# Altium schematic symbol library Capacitor - Aluminium TH.SchLib: 4591 symbols (part 5 of 27) (continued)
## B43821A9475M (continued)
CAP ALUM 4.7UF 20% 400V RADIAL; Part Number: B43821A9475M; Manufacturer: EPCOS (TDK); TemperatureRange: -25C ~ 85C; Type: Polar; Ripple Current: 60mA @ 120Hz; Value: 4.7uF; PartId: 25363; Supplier 1: Digi-Key; Supplier Part Number 1: 495-6011-ND; ComponentLink1Description: Datasheet; ComponentLink1URL: //media.digikey.com/pdf/Data%20Sheets/Epcos%20PDFs/B41821_43821_Series_2006.pdf; ComponentLink2Description: Digi-Key Listing; ComponentLink2URL: https://www.digikey.com/product-detail/en/epcos-tdk/B43821A9475M/495-6011-ND/3543703; Tolerance: 20%; Voltage: 400V; Price: 0.71; Device Package: Radial, Can, 10mm
footprint CAP AL TH D10 L5 H17.5
pins: 1, 2

## B43821F9226M
designator C?, comment 22uF  (value not drawn)
CAP ALUM 22UF 20% 400V RADIAL; Part Number: B43821F9226M; Manufacturer: EPCOS (TDK); TemperatureRange: -25C ~ 85C; Type: Polar; Ripple Current: 200mA @ 120Hz; Value: 22uF; PartId: 24082; Supplier 1: Digi-Key; Supplier Part Number 1: 495-6066-ND; ComponentLink1Description: Datasheet; ComponentLink1URL: http://en.tdk.eu/inf/20/30/db/aec_2013/B41821_B43821.pdf; ComponentLink2Description: Digi-Key Listing; ComponentLink2URL: https://www.digikey.com/product-detail/en/epcos-tdk/B43821F9226M/495-6066-ND/3544459; Tolerance: 20%; Voltage: 400V; Price: 1.22; Device Package: Radial, Can, 12.5mm
footprint CAP AL TH D12.5 L5 H27
pins: 1, 2

## B43851A4106M
designator C?, comment 10uF  (value not drawn)
CAP ALUM 10UF 20% 350V RADIAL; Part Number: B43851A4106M; Manufacturer: EPCOS (TDK); Type: Polar; Ripple Current: 67mA @ 120Hz; Value: 10uF; PartId: 25986; Supplier 1: Digi-Key; Supplier Part Number 1: 495-6031-ND; ComponentLink1Description: Datasheet; ComponentLink1URL: //media.digikey.com/pdf/Data%20Sheets/Epcos%20PDFs/B41851,B43851.pdf; ComponentLink2Description: Digi-Key Listing; ComponentLink2URL: https://www.digikey.com/product-detail/en/epcos-tdk/B43851A4106M/495-6031-ND/3543989; Tolerance: 20%; Voltage: 350V; Price: 0.96; Device Package: Radial, Can, 10mm
footprint CAP AL TH D10 L5 H22
pins: 1, 2

## B43851A9106M
designator C?, comment 10uF  (value not drawn)
CAP ALUM 10UF 20% 400V RADIAL; Part Number: B43851A9106M; Manufacturer: EPCOS (TDK); Type: Polar; Ripple Current: 67mA @ 120Hz; Value: 10uF; PartId: 25950; Supplier 1: Digi-Key; Supplier Part Number 1: 495-6020-ND; ComponentLink1Description: Datasheet; ComponentLink1URL: http://en.tdk.eu/inf/20/30/db/aec_2013/B41851_B43851.pdf; ComponentLink2Description: Digi-Key Listing; ComponentLink2URL: https://www.digikey.com/product-detail/en/epcos-tdk/B43851A9106M/495-6020-ND/3543992; Tolerance: 20%; Voltage: 400V; Price: 0.76; Device Package: Radial, Can, 10mm
footprint CAP AL TH D10 L5 H22
pins: 1, 2

## B43851A9226M
designator C?, comment 22uF  (value not drawn)
CAP ALUM 22UF 20% 400V RADIAL; Part Number: B43851A9226M; Manufacturer: EPCOS (TDK); Type: Polar; Ripple Current: 126mA @ 120Hz; Value: 22uF; PartId: 26487; Supplier 1: Digi-Key; Supplier Part Number 1: 495-6067-ND; ComponentLink1Description: Datasheet; ComponentLink1URL: //media.digikey.com/pdf/Data%20Sheets/Epcos%20PDFs/B41851,B43851.pdf; ComponentLink2Description: Digi-Key Listing; ComponentLink2URL: https://www.digikey.com/product-detail/en/epcos-tdk/B43851A9226M/495-6067-ND/3544470; Tolerance: 20%; Voltage: 400V; Price: 1.83; Device Package: Radial, Can, 16mm
footprint CAP AL TH D16 L7.5 H22
pins: 1, 2

## B43851A9336M
designator C?, comment 33uF  (value not drawn)
CAP ALUM 33UF 20% 400V RADIAL; Part Number: B43851A9336M; Manufacturer: EPCOS (TDK); Type: Polar; Ripple Current: 168mA @ 120Hz; Value: 33uF; PartId: 26963; Supplier 1: Digi-Key; Supplier Part Number 1: 495-6068-ND; ComponentLink1Description: Datasheet; ComponentLink1URL: //media.digikey.com/pdf/Data%20Sheets/Epcos%20PDFs/B41851,B43851.pdf; ComponentLink2Description: Digi-Key Listing; ComponentLink2URL: https://www.digikey.com/product-detail/en/epcos-tdk/B43851A9336M/495-6068-ND/3544472; Tolerance: 20%; Voltage: 400V; Price: 2.3; Device Package: Radial, Can, 16mm
footprint CAP AL TH D16 L7.5 H27
pins: 1, 2

## B43851F9226M
designator C?, comment 22uF  (value not drawn)
CAP ALUM 22UF 20% 400V RADIAL; Part Number: B43851F9226M; Manufacturer: EPCOS (TDK); Type: Polar; Ripple Current: 140mA @ 120Hz; Value: 22uF; PartId: 24100; Supplier 1: Digi-Key; Supplier Part Number 1: 495-6069-ND; ComponentLink1Description: Datasheet; ComponentLink1URL: http://en.tdk.eu/inf/20/30/db/aec_2013/B41851_B43851.pdf; ComponentLink2Description: Digi-Key Listing; ComponentLink2URL: https://www.digikey.com/product-detail/en/epcos-tdk/B43851F9226M/495-6069-ND/3544476; Tolerance: 20%; Voltage: 400V; Price: 1.31; Device Package: Radial, Can, 12.5mm
footprint CAP AL TH D12.5 L5 H27
pins: 1, 2

## B43858A4106M
designator C?, comment 10uF  (value not drawn)
CAP ALUM 10UF 20% 350V RADIAL; Part Number: B43858A4106M; Manufacturer: EPCOS (TDK); TemperatureRange: -25C ~ 105C; Type: Polar; Ripple Current: 300mA @ 100kHz; Value: 10uF; PartId: 24112; Supplier 1: Digi-Key; Supplier Part Number 1: 495-6070-ND; ComponentLink1Description: Datasheet; ComponentLink1URL: //media.digikey.com/pdf/Data%20Sheets/Epcos%20PDFs/B43858_Oct_2002.pdf; ComponentLink2Description: Digi-Key Listing; ComponentLink2URL: https://www.digikey.com/product-detail/en/epcos-tdk/B43858A4106M/495-6070-ND/3544485; Tolerance: 20%; Voltage: 350V; Price: 1.38; Device Package: Radial, Can, 12.5mm
footprint CAP AL TH D12.5 L5 H27
pins: 1, 2

## B43858A9475M
designator C?, comment 4.7uF  (value not drawn)
CAP ALUM 4.7UF 20% 400V RADIAL; Part Number: B43858A9475M; Manufacturer: EPCOS (TDK); TemperatureRange: -25C ~ 105C; Type: Polar; Ripple Current: 180mA @ 100kHz; Value: 4.7uF; PartId: 25989; Supplier 1: Digi-Key; Supplier Part Number 1: 495-6032-ND; ComponentLink1Description: Datasheet; ComponentLink1URL: //media.digikey.com/pdf/Data%20Sheets/Epcos%20PDFs/B43858_Oct_2002.pdf; ComponentLink2Description: Digi-Key Listing; ComponentLink2URL: https://www.digikey.com/product-detail/en/epcos-tdk/B43858A9475M/495-6032-ND/3544023; Tolerance: 20%; Voltage: 400V; Price: 1.02; Device Package: Radial, Can, 10mm
footprint CAP AL TH D10 L5 H22
pins: 1, 2

## B43858C4475M
designator C?, comment 4.7uF  (value not drawn)
CAP ALUM 4.7UF 20% 350V RADIAL; Part Number: B43858C4475M; Manufacturer: EPCOS (TDK); TemperatureRange: -25C ~ 105C; Type: Polar; Ripple Current: 180mA @ 100kHz; Value: 4.7uF; PartId: 25405; Supplier 1: Digi-Key; Supplier Part Number 1: 495-6014-ND; ComponentLink1Description: Datasheet; ComponentLink1URL: //media.digikey.com/pdf/Data%20Sheets/Epcos%20PDFs/B43858_Nov08.pdf; ComponentLink2Description: Digi-Key Listing; ComponentLink2URL: https://www.digikey.com/product-detail/en/epcos-tdk/B43858C4475M/495-6014-ND/3543744; Tolerance: 20%; Voltage: 350V; Price: 0.81; Device Package: Radial, Can, 10mm
footprint CAP AL TH D10 L5 H17.5
pins: 1, 2

## B43858C9106M
designator C?, comment 10uF  (value not drawn)
CAP ALUM 10UF 20% 400V RADIAL; Part Number: B43858C9106M; Manufacturer: EPCOS (TDK); TemperatureRange: -25C ~ 105C; Type: Polar; Ripple Current: 300mA @ 100kHz; Value: 10uF; PartId: 25988; Supplier 1: Digi-Key; Supplier Part Number 1: 495-6033-ND; ComponentLink1Description: Datasheet; ComponentLink1URL: //media.digikey.com/pdf/Data%20Sheets/Epcos%20PDFs/B43858_Nov08.pdf; ComponentLink2Description: Digi-Key Listing; ComponentLink2URL: https://www.digikey.com/product-detail/en/epcos-tdk/B43858C9106M/495-6033-ND/3544046; Tolerance: 20%; Voltage: 400V; Price: 1; Device Package: Radial, Can, 10mm
footprint CAP AL TH D10 L5 H22
pins: 1, 2

## B43858C9685M
designator C?, comment 6.8uF  (value not drawn)
CAP ALUM 6.8UF 20% 400V RADIAL; Part Number: B43858C9685M; Manufacturer: EPCOS (TDK); TemperatureRange: -25C ~ 105C; Type: Polar; Ripple Current: 270mA @ 100kHz; Value: 6.8uF; PartId: 25409; Supplier 1: Digi-Key; Supplier Part Number 1: 495-6016-ND; ComponentLink1Description: Datasheet; ComponentLink1URL: //media.digikey.com/pdf/Data%20Sheets/Epcos%20PDFs/B43858_Nov08.pdf; ComponentLink2Description: Digi-Key Listing; ComponentLink2URL: https://www.digikey.com/product-detail/en/epcos-tdk/B43858C9685M/495-6016-ND/3543752; Tolerance: 20%; Voltage: 400V; Price: 0.83; Device Package: Radial, Can, 10mm
footprint CAP AL TH D10 L5 H17.5
pins: 1, 2

## B43858F2476M
designator C?, comment 47uF  (value not drawn)
CAP ALUM 47UF 20% 250V RADIAL; Part Number: B43858F2476M; Manufacturer: EPCOS (TDK); TemperatureRange: -40C ~ 105C; Type: Polar; Ripple Current: 840mA @ 100kHz; Value: 47uF; PartId: 26943; Supplier 1: Digi-Key; Supplier Part Number 1: 495-6071-ND; ComponentLink1Description: Datasheet; ComponentLink1URL: //media.digikey.com/pdf/Data%20Sheets/Epcos%20PDFs/B43858_Oct_2002.pdf; ComponentLink2Description: Digi-Key Listing; ComponentLink2URL: https://www.digikey.com/product-detail/en/epcos-tdk/B43858F2476M/495-6071-ND/3544507; Tolerance: 20%; Voltage: 250V; Price: 1.93; Device Package: Radial, Can, 16mm
footprint CAP AL TH D16 L7.5 H27
pins: 1, 2

## B43866C5156M
designator C?, comment 15uF  (value not drawn)
CAP ALUM 15UF 20% 450V RADIAL; Part Number: B43866C5156M; Manufacturer: EPCOS (TDK); TemperatureRange: -25C ~ 125C; Type: Polar; Ripple Current: 250mA @ 100kHz; Value: 15uF; PartId: 24141; Supplier 1: Digi-Key; Supplier Part Number 1: 495-6072-ND; ComponentLink1Description: Datasheet; ComponentLink1URL: //media.digikey.com/pdf/Data%20Sheets/Epcos%20PDFs/B43866_Series_2010.pdf; ComponentLink2Description: Digi-Key Listing; ComponentLink2URL: https://www.digikey.com/product-detail/en/epcos-tdk/B43866C5156M/495-6072-ND/3500152; Tolerance: 20%; Voltage: 450V; Price: 1.48; Device Package: Radial, Can, 12.5mm
footprint CAP AL TH D12.5 L5 H27
pins: 1, 2

## B43866C9106M
designator C?, comment 10uF  (value not drawn)
CAP ALUM 10UF 20% 400V RADIAL; Part Number: B43866C9106M; Manufacturer: EPCOS (TDK); TemperatureRange: -25C ~ 125C; Type: Polar; Ripple Current: 160mA @ 100kHz; Value: 10uF; PartId: 25987; Supplier 1: Digi-Key; Supplier Part Number 1: 495-6034-ND; ComponentLink1Description: Datasheet; ComponentLink1URL: //media.digikey.com/pdf/Data%20Sheets/Epcos%20PDFs/B43866_Series_2010.pdf; ComponentLink2Description: Digi-Key Listing; ComponentLink2URL: https://www.digikey.com/product-detail/en/epcos-tdk/B43866C9106M/495-6034-ND/3500158; Tolerance: 20%; Voltage: 400V; Price: 0.99; Device Package: Radial, Can, 10mm
footprint CAP AL TH D10 L5 H22
pins: 1, 2

## B43888F2107M
designator C?, comment 100uF  (value not drawn)
CAP ALUM 100UF 20% 250V RADIAL; Part Number: B43888F2107M; Manufacturer: EPCOS (TDK); Type: Polar; Ripple Current: 1.18A @ 100kHz; Value: 100uF; PartId: 27273; Supplier 1: Digi-Key; Supplier Part Number 1: 495-6080-ND; ComponentLink1Description: Datasheet; ComponentLink1URL: //media.digikey.com/pdf/Data%20Sheets/Epcos%20PDFs/B43888_Series.pdf; ComponentLink2Description: Digi-Key Listing; ComponentLink2URL: https://www.digikey.com/product-detail/en/epcos-tdk/B43888F2107M/495-6080-ND/3544680; Tolerance: 20%; Voltage: 250V; Price: 3.05; Device Package: Radial, Can, 16mm
footprint CAP AL TH D16 L7.5 H33.5
pins: 1, 2

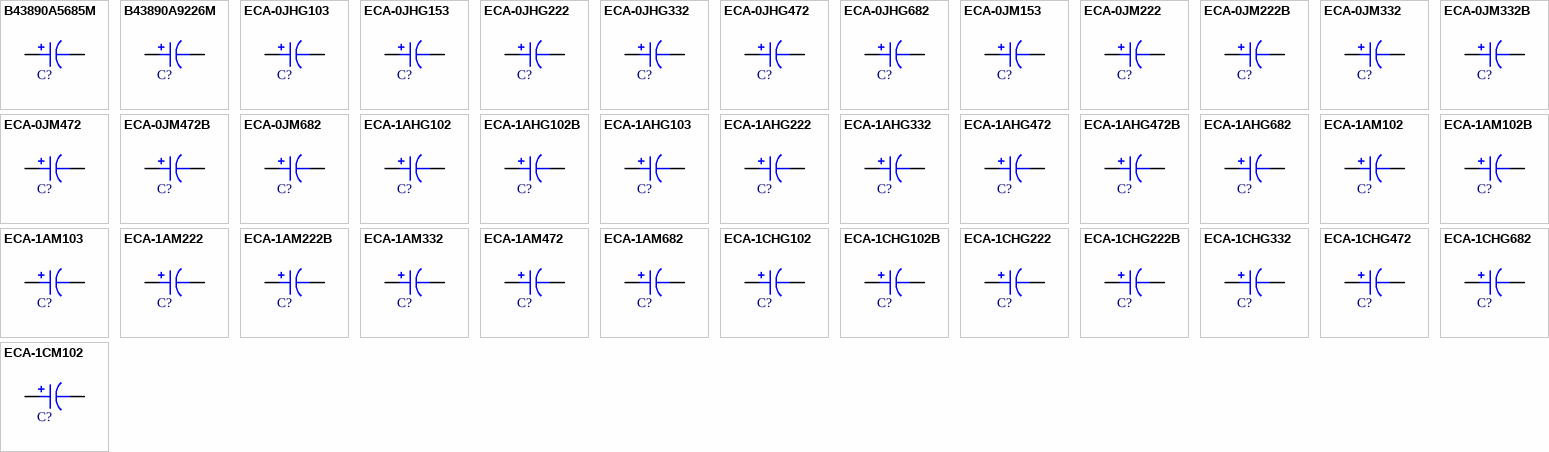
[diagram p19: symbols B43890A5685M to ECA-1CM102]

## B43890A5685M
designator C?, comment 6.8uF  (value not drawn)
CAP ALUM 6.8UF 20% 450V RADIAL; Part Number: B43890A5685M; Manufacturer: EPCOS (TDK); TemperatureRange: -25C ~ 105C; Type: Polar; Ripple Current: 262mA @ 100kHz; Value: 6.8uF; PartId: 25967; Supplier 1: Digi-Key; Supplier Part Number 1: 495-6035-ND; ComponentLink1Description: Datasheet; ComponentLink1URL: https://en.tdk.eu/inf/20/30/db/aec/B43890.pdf; ComponentLink2Description: Digi-Key Listing; ComponentLink2URL: https://www.digikey.com/product-detail/en/epcos-tdk/B43890A5685M/495-6035-ND/3500178; Tolerance: 20%; Voltage: 450V; Price: 0.85; Device Package: Radial, Can, 10mm
footprint CAP AL TH D10 L5 H22
pins: 1, 2

## B43890A9226M
designator C?, comment 22uF  (value not drawn)
CAP ALUM 22UF 20% 400V RADIAL; Part Number: B43890A9226M; Manufacturer: EPCOS (TDK); TemperatureRange: -25C ~ 105C; Type: Polar; Ripple Current: 590mA @ 100kHz; Value: 22uF; PartId: 24084; Supplier 1: Digi-Key; Supplier Part Number 1: 495-6073-ND; ComponentLink1Description: Datasheet; ComponentLink1URL: https://en.tdk.eu/inf/20/30/db/aec/B43890.pdf; ComponentLink2Description: Digi-Key Listing; ComponentLink2URL: https://www.digikey.com/product-detail/en/epcos-tdk/B43890A9226M/495-6073-ND/3500182; Tolerance: 20%; Voltage: 400V; Price: 1.23; Device Package: Radial, Can, 12.5mm
footprint CAP AL TH D12.5 L5 H27
pins: 1, 2

## ECA-0JHG103
designator C?, comment 10000uF  (value not drawn)
CAP ALUM 10000UF 20% 6.3V RADIAL; Part Number: ECA-0JHG103; Manufacturer: Panasonic Electronic Components; TemperatureRange: -55C ~ 105C; Type: Polar; Ripple Current: 1.65A @ 120Hz; Value: 10000uF; PartId: 26881; Supplier 1: Digi-Key; Supplier Part Number 1: P5514-ND; ComponentLink1Description: Datasheet; ComponentLink1URL: https://industrial.panasonic.com/cdbs/www-data/pdf/RDF0000/ABA0000C1038.pdf; ComponentLink2Description: Digi-Key Listing; ComponentLink2URL: https://www.digikey.com/product-detail/en/panasonic-electronic-components/ECA-0JHG103/P5514-ND/245113; Tolerance: 20%; Voltage: 6.3V; Price: 1.31; Device Package: Radial, Can, 16mm
footprint CAP AL TH D16 L7.5 H27
pins: 1, 2

## ECA-0JHG153
designator C?, comment 15000uF  (value not drawn)
CAP ALUM 15000UF 20% 6.3V RADIAL; Part Number: ECA-0JHG153; Manufacturer: Panasonic Electronic Components; TemperatureRange: -55C ~ 105C; Type: Polar; Ripple Current: 2.01A @ 120Hz; Value: 15000uF; PartId: 27113; Supplier 1: Digi-Key; Supplier Part Number 1: P5515-ND; ComponentLink1Description: Datasheet; ComponentLink1URL: https://industrial.panasonic.com/cdbs/www-data/pdf/RDF0000/ABA0000C1038.pdf; ComponentLink2Description: Digi-Key Listing; ComponentLink2URL: https://www.digikey.com/product-detail/en/panasonic-electronic-components/ECA-0JHG153/P5515-ND/245114; Tolerance: 20%; Voltage: 6.3V; Price: 1.75; Device Package: Radial, Can, 16mm
footprint CAP AL TH D16 L7.5 H33.5
pins: 1, 2

## ECA-0JHG222
designator C?, comment 2200uF  (value not drawn)
CAP ALUM 2200UF 20% 6.3V RADIAL; Part Number: ECA-0JHG222; Manufacturer: Panasonic Electronic Components; TemperatureRange: -55C ~ 105C; Type: Polar; Ripple Current: 710mA @ 120Hz; Value: 2200uF; PartId: 25259; Supplier 1: Digi-Key; Supplier Part Number 1: P5510-ND; ComponentLink1Description: Datasheet; ComponentLink1URL: https://industrial.panasonic.com/cdbs/www-data/pdf/RDF0000/ABA0000C1038.pdf; ComponentLink2Description: Digi-Key Listing; ComponentLink2URL: https://www.digikey.com/product-detail/en/panasonic-electronic-components/ECA-0JHG222/P5510-ND/245109; Tolerance: 20%; Voltage: 6.3V; Price: 0.59; Device Package: Radial, Can, 10mm
footprint CAP AL TH D10 L5 H17.5
pins: 1, 2

## ECA-0JHG332
designator C?, comment 3300uF  (value not drawn)
CAP ALUM 3300UF 20% 6.3V RADIAL; Part Number: ECA-0JHG332; Manufacturer: Panasonic Electronic Components; TemperatureRange: -55C ~ 105C; Type: Polar; Ripple Current: 840mA @ 120Hz; Value: 3300uF; PartId: 25875; Supplier 1: Digi-Key; Supplier Part Number 1: P5511-ND; ComponentLink1Description: Datasheet; ComponentLink1URL: https://industrial.panasonic.com/cdbs/www-data/pdf/RDF0000/ABA0000C1038.pdf; ComponentLink2Description: Digi-Key Listing; ComponentLink2URL: https://www.digikey.com/product-detail/en/panasonic-electronic-components/ECA-0JHG332/P5511-ND/245110; Tolerance: 20%; Voltage: 6.3V; Price: 0.64; Device Package: Radial, Can, 10mm
footprint CAP AL TH D10 L5 H22
pins: 1, 2

## ECA-0JHG472
designator C?, comment 4700uF  (value not drawn)
CAP ALUM 4700UF 20% 6.3V RADIAL; Part Number: ECA-0JHG472; Manufacturer: Panasonic Electronic Components; TemperatureRange: -55C ~ 105C; Type: Polar; Ripple Current: 1.09A @ 120Hz; Value: 4700uF; PartId: 23293; Supplier 1: Digi-Key; Supplier Part Number 1: P5512-ND; ComponentLink1Description: Datasheet; ComponentLink1URL: https://industrial.panasonic.com/cdbs/www-data/pdf/RDF0000/ABA0000C1038.pdf; ComponentLink2Description: Digi-Key Listing; ComponentLink2URL: https://www.digikey.com/product-detail/en/panasonic-electronic-components/ECA-0JHG472/P5512-ND/245111; Tolerance: 20%; Voltage: 6.3V; Price: 0.8; Device Package: Radial, Can, 12.5mm
footprint CAP AL TH D12.5 L5 H22
pins: 1, 2

## ECA-0JHG682
designator C?, comment 6800uF  (value not drawn)
CAP ALUM 6800UF 20% 6.3V RADIAL; Part Number: ECA-0JHG682; Manufacturer: Panasonic Electronic Components; TemperatureRange: -55C ~ 105C; Type: Polar; Ripple Current: 1.35A @ 120Hz; Value: 6800uF; PartId: 23972; Supplier 1: Digi-Key; Supplier Part Number 1: P5513-ND; ComponentLink1Description: Datasheet; ComponentLink1URL: https://industrial.panasonic.com/cdbs/www-data/pdf/RDF0000/ABA0000C1038.pdf; ComponentLink2Description: Digi-Key Listing; ComponentLink2URL: https://www.digikey.com/product-detail/en/panasonic-electronic-components/ECA-0JHG682/P5513-ND/245112; Tolerance: 20%; Voltage: 6.3V; Price: 1.01; Device Package: Radial, Can, 12.5mm
footprint CAP AL TH D12.5 L5 H27
pins: 1, 2

## ECA-0JM153
designator C?, comment 15000uF  (value not drawn)
CAP ALUM 15000UF 20% 6.3V RADIAL; Part Number: ECA-0JM153; Manufacturer: Panasonic Electronic Components; TemperatureRange: -40C ~ 85C; Type: Polar; Ripple Current: 1.7A @ 120Hz; Value: 15000uF; PartId: 26996; Supplier 1: Digi-Key; Supplier Part Number 1: P5121-ND; ComponentLink1Description: Datasheet; ComponentLink1URL: https://industrial.panasonic.com/cdbs/www-data/pdf/RDF0000/ABA0000C81.pdf; ComponentLink2Description: Digi-Key Listing; ComponentLink2URL: https://www.digikey.com/product-detail/en/panasonic-electronic-components/ECA-0JM153/P5121-ND/244980; Tolerance: 20%; Voltage: 6.3V; Price: 1.31; Device Package: Radial, Can, 16mm
footprint CAP AL TH D16 L7.5 H33.5
pins: 1, 2

## ECA-0JM222
designator C?, comment 2200uF  (value not drawn)
CAP ALUM 2200UF 20% 6.3V RADIAL; Part Number: ECA-0JM222; Manufacturer: Panasonic Electronic Components; TemperatureRange: -40C ~ 85C; Type: Polar; Ripple Current: 890mA @ 120Hz; Value: 2200uF; PartId: 25193; Supplier 1: Digi-Key; Supplier Part Number 1: P5116-ND; ComponentLink1Description: Datasheet; ComponentLink1URL: https://industrial.panasonic.com/cdbs/www-data/pdf/RDF0000/ABA0000C81.pdf; ComponentLink2Description: Digi-Key Listing; ComponentLink2URL: https://www.digikey.com/product-detail/en/panasonic-electronic-components/ECA-0JM222/P5116-ND/244975; Tolerance: 20%; Voltage: 6.3V; Price: 0.49; Device Package: Radial, Can, 10mm
footprint CAP AL TH D10 L5 H17.5
pins: 1, 2

## ECA-0JM222B
designator C?, comment 2200uF  (value not drawn)
CAP ALUM 2200UF 20% 6.3V RADIAL; Part Number: ECA-0JM222B; Manufacturer: Panasonic Electronic Components; TemperatureRange: -40C ~ 85C; Type: Polar; Ripple Current: 890mA @ 120Hz; Value: 2200uF; PartId: 24999; Supplier 1: Digi-Key; Supplier Part Number 1: P10360TB-ND; ComponentLink1Description: Datasheet; ComponentLink1URL: https://industrial.panasonic.com/cdbs/www-data/pdf/RDF0000/ABA0000C81.pdf; ComponentLink2Description: Digi-Key Listing; ComponentLink2URL: https://www.digikey.com/product-detail/en/panasonic-electronic-components/ECA-0JM222B/P10360TB-ND/268445; Tolerance: 20%; Voltage: 6.3V; Price: 0.1468; Device Package: Radial, Can, 10mm
footprint CAP AL TH D10 L5 H17.5
pins: 1, 2

## ECA-0JM332
designator C?, comment 3300uF  (value not drawn)
CAP ALUM 3300UF 20% 6.3V RADIAL; Part Number: ECA-0JM332; Manufacturer: Panasonic Electronic Components; TemperatureRange: -40C ~ 85C; Type: Polar; Ripple Current: 1.02A @ 120Hz; Value: 3300uF; PartId: 25852; Supplier 1: Digi-Key; Supplier Part Number 1: P5117-ND; ComponentLink1Description: Datasheet; ComponentLink1URL: https://industrial.panasonic.com/cdbs/www-data/pdf/RDF0000/ABA0000C81.pdf; ComponentLink2Description: Digi-Key Listing; ComponentLink2URL: https://www.digikey.com/product-detail/en/panasonic-electronic-components/ECA-0JM332/P5117-ND/244976; Tolerance: 20%; Voltage: 6.3V; Price: 0.55; Device Package: Radial, Can, 10mm
footprint CAP AL TH D10 L5 H22
pins: 1, 2

## ECA-0JM332B
designator C?, comment 3300uF  (value not drawn)
CAP ALUM 3300UF 20% 6.3V RADIAL; Part Number: ECA-0JM332B; Manufacturer: Panasonic Electronic Components; TemperatureRange: -40C ~ 85C; Type: Polar; Ripple Current: 1.02A @ 120Hz; Value: 3300uF; PartId: 25750; Supplier 1: Digi-Key; Supplier Part Number 1: P10361TB-ND; ComponentLink1Description: Datasheet; ComponentLink1URL: https://industrial.panasonic.com/cdbs/www-data/pdf/RDF0000/ABA0000C81.pdf; ComponentLink2Description: Digi-Key Listing; ComponentLink2URL: https://www.digikey.com/product-detail/en/panasonic-electronic-components/ECA-0JM332B/P10361TB-ND/268446; Tolerance: 20%; Voltage: 6.3V; Price: 0.2014; Device Package: Radial, Can, 10mm
footprint CAP AL TH D10 L5 H22
pins: 1, 2

## ECA-0JM472
designator C?, comment 4700uF  (value not drawn)
CAP ALUM 4700UF 20% 6.3V RADIAL; Part Number: ECA-0JM472; Manufacturer: Panasonic Electronic Components; TemperatureRange: -40C ~ 85C; Type: Polar; Ripple Current: 1.17A @ 120Hz; Value: 4700uF; PartId: 23236; Supplier 1: Digi-Key; Supplier Part Number 1: P5118-ND; ComponentLink1Description: Datasheet; ComponentLink1URL: https://industrial.panasonic.com/cdbs/www-data/pdf/RDF0000/ABA0000C81.pdf; ComponentLink2Description: Digi-Key Listing; ComponentLink2URL: https://www.digikey.com/product-detail/en/panasonic-electronic-components/ECA-0JM472/P5118-ND/244977; Tolerance: 20%; Voltage: 6.3V; Price: 0.68; Device Package: Radial, Can, 12.5mm
footprint CAP AL TH D12.5 L5 H22
pins: 1, 2

## ECA-0JM472B
designator C?, comment 4700uF  (value not drawn)
CAP ALUM 4700UF 20% 6.3V RADIAL; Part Number: ECA-0JM472B; Manufacturer: Panasonic Electronic Components; TemperatureRange: -40C ~ 85C; Type: Polar; Ripple Current: 1.17A @ 120Hz; Value: 4700uF; PartId: 23142; Supplier 1: Digi-Key; Supplier Part Number 1: P10362TB-ND; ComponentLink1Description: Datasheet; ComponentLink1URL: https://industrial.panasonic.com/cdbs/www-data/pdf/RDF0000/ABA0000C81.pdf; ComponentLink2Description: Digi-Key Listing; ComponentLink2URL: https://www.digikey.com/product-detail/en/panasonic-electronic-components/ECA-0JM472B/P10362TB-ND/268447; Tolerance: 20%; Voltage: 6.3V; Price: 0.2734; Device Package: Radial, Can, 12.5mm
footprint CAP AL TH D12.5 L5 H22
pins: 1, 2

## ECA-0JM682
designator C?, comment 6800uF  (value not drawn)
CAP ALUM 6800UF 20% 6.3V RADIAL; Part Number: ECA-0JM682; Manufacturer: Panasonic Electronic Components; TemperatureRange: -40C ~ 85C; Type: Polar; Ripple Current: 1.27A @ 120Hz; Value: 6800uF; PartId: 23879; Supplier 1: Digi-Key; Supplier Part Number 1: P5119-ND; ComponentLink1Description: Datasheet; ComponentLink1URL: https://industrial.panasonic.com/cdbs/www-data/pdf/RDF0000/ABA0000C81.pdf; ComponentLink2Description: Digi-Key Listing; ComponentLink2URL: https://www.digikey.com/product-detail/en/panasonic-electronic-components/ECA-0JM682/P5119-ND/244978; Tolerance: 20%; Voltage: 6.3V; Price: 0.83; Device Package: Radial, Can, 12.5mm
footprint CAP AL TH D12.5 L5 H27
pins: 1, 2

## ECA-1AHG102
designator C?, comment 1000uF  (value not drawn)
CAP ALUM 1000UF 20% 10V RADIAL; Part Number: ECA-1AHG102; Manufacturer: Panasonic Electronic Components; TemperatureRange: -55C ~ 105C; Type: Polar; Ripple Current: 460mA @ 120Hz; Value: 1000uF; PartId: 24848; Supplier 1: Digi-Key; Supplier Part Number 1: P5521-ND; ComponentLink1Description: Datasheet; ComponentLink1URL: https://industrial.panasonic.com/cdbs/www-data/pdf/RDF0000/ABA0000C1038.pdf; ComponentLink2Description: Digi-Key Listing; ComponentLink2URL: https://www.digikey.com/product-detail/en/panasonic-electronic-components/ECA-1AHG102/P5521-ND/245120; Tolerance: 20%; Voltage: 10V; Price: 0.47; Device Package: Radial, Can, 10mm
footprint CAP AL TH D10 L5 H14.5
pins: 1, 2

## ECA-1AHG102B
designator C?, comment 1000uF  (value not drawn)
CAP ALUM 1000UF 20% 10V RADIAL; Part Number: ECA-1AHG102B; Manufacturer: Panasonic Electronic Components; TemperatureRange: -55C ~ 105C; Type: Polar; Ripple Current: 460mA @ 120Hz; Value: 1000uF; PartId: 24592; Supplier 1: Digi-Key; Supplier Part Number 1: P19509TB-ND; ComponentLink1Description: Datasheet; ComponentLink1URL: https://industrial.panasonic.com/cdbs/www-data/pdf/RDF0000/ABA0000C1038.pdf; ComponentLink2Description: Digi-Key Listing; ComponentLink2URL: https://www.digikey.com/product-detail/en/panasonic-electronic-components/ECA-1AHG102B/P19509TB-ND/2688625; Tolerance: 20%; Voltage: 10V; Price: 0.1728; Device Package: Radial, Can, 10mm
footprint CAP AL TH D10 L5 H14.5
pins: 1, 2

## ECA-1AHG103
designator C?, comment 10000uF  (value not drawn)
CAP ALUM 10000UF 20% 10V RADIAL; Part Number: ECA-1AHG103; Manufacturer: Panasonic Electronic Components; TemperatureRange: -55C ~ 105C; Type: Polar; Ripple Current: 1.89A @ 120Hz; Value: 10000uF; PartId: 27115; Supplier 1: Digi-Key; Supplier Part Number 1: P5526-ND; ComponentLink1Description: Datasheet; ComponentLink1URL: https://industrial.panasonic.com/cdbs/www-data/pdf/RDF0000/ABA0000C1038.pdf; ComponentLink2Description: Digi-Key Listing; ComponentLink2URL: https://www.digikey.com/product-detail/en/panasonic-electronic-components/ECA-1AHG103/P5526-ND/245125; Tolerance: 20%; Voltage: 10V; Price: 1.75; Device Package: Radial, Can, 16mm
footprint CAP AL TH D16 L7.5 H33.5
pins: 1, 2

## ECA-1AHG222
designator C?, comment 2200uF  (value not drawn)
CAP ALUM 2200UF 20% 10V RADIAL; Part Number: ECA-1AHG222; Manufacturer: Panasonic Electronic Components; TemperatureRange: -55C ~ 105C; Type: Polar; Ripple Current: 760mA @ 120Hz; Value: 2200uF; PartId: 25885; Supplier 1: Digi-Key; Supplier Part Number 1: P5522-ND; ComponentLink1Description: Datasheet; ComponentLink1URL: https://industrial.panasonic.com/cdbs/www-data/pdf/RDF0000/ABA0000C1038.pdf; ComponentLink2Description: Digi-Key Listing; ComponentLink2URL: https://www.digikey.com/product-detail/en/panasonic-electronic-components/ECA-1AHG222/P5522-ND/245121; Tolerance: 20%; Voltage: 10V; Price: 0.65; Device Package: Radial, Can, 10mm
footprint CAP AL TH D10 L5 H22
pins: 1, 2

## ECA-1AHG332
designator C?, comment 3300uF  (value not drawn)
CAP ALUM 3300UF 20% 10V RADIAL; Part Number: ECA-1AHG332; Manufacturer: Panasonic Electronic Components; TemperatureRange: -55C ~ 105C; Type: Polar; Ripple Current: 1A @ 120Hz; Value: 3300uF; PartId: 23330; Supplier 1: Digi-Key; Supplier Part Number 1: P5523-ND; ComponentLink1Description: Datasheet; ComponentLink1URL: https://industrial.panasonic.com/cdbs/www-data/pdf/RDF0000/ABA0000C1038.pdf; ComponentLink2Description: Digi-Key Listing; ComponentLink2URL: https://www.digikey.com/product-detail/en/panasonic-electronic-components/ECA-1AHG332/P5523-ND/245122; Tolerance: 20%; Voltage: 10V; Price: 0.83; Device Package: Radial, Can, 12.5mm
footprint CAP AL TH D12.5 L5 H22
pins: 1, 2

## ECA-1AHG472
designator C?, comment 4700uF  (value not drawn)
CAP ALUM 4700UF 20% 10V RADIAL; Part Number: ECA-1AHG472; Manufacturer: Panasonic Electronic Components; TemperatureRange: -55C ~ 105C; Type: Polar; Ripple Current: 1.26A @ 120Hz; Value: 4700uF; PartId: 23966; Supplier 1: Digi-Key; Supplier Part Number 1: P5524-ND; ComponentLink1Description: Datasheet; ComponentLink1URL: https://industrial.panasonic.com/cdbs/www-data/pdf/RDF0000/ABA0000C1038.pdf; ComponentLink2Description: Digi-Key Listing; ComponentLink2URL: https://www.digikey.com/product-detail/en/panasonic-electronic-components/ECA-1AHG472/P5524-ND/245123; Tolerance: 20%; Voltage: 10V; Price: 1; Device Package: Radial, Can, 12.5mm
footprint CAP AL TH D12.5 L5 H27
pins: 1, 2

## ECA-1AHG472B
designator C?, comment 4700uF  (value not drawn)
CAP ALUM 4700UF 20% 10V RADIAL; Part Number: ECA-1AHG472B; Manufacturer: Panasonic Electronic Components; TemperatureRange: -55C ~ 105C; Type: Polar; Ripple Current: 1.26A @ 120Hz; Value: 4700uF; PartId: 23817; Supplier 1: Digi-Key; Supplier Part Number 1: P19510TB-ND; ComponentLink1Description: Datasheet; ComponentLink1URL: https://industrial.panasonic.com/cdbs/www-data/pdf/RDF0000/ABA0000C1038.pdf; ComponentLink2Description: Digi-Key Listing; ComponentLink2URL: https://www.digikey.com/product-detail/en/panasonic-electronic-components/ECA-1AHG472B/P19510TB-ND/2688635; Tolerance: 20%; Voltage: 10V; Price: 0.4279; Device Package: Radial, Can, 12.5mm
footprint CAP AL TH D12.5 L5 H27
pins: 1, 2

## ECA-1AHG682
designator C?, comment 6800uF  (value not drawn)
CAP ALUM 6800UF 20% 10V RADIAL; Part Number: ECA-1AHG682; Manufacturer: Panasonic Electronic Components; TemperatureRange: -55C ~ 105C; Type: Polar; Ripple Current: 1.57A @ 120Hz; Value: 6800uF; PartId: 26885; Supplier 1: Digi-Key; Supplier Part Number 1: P5525-ND; ComponentLink1Description: Datasheet; ComponentLink1URL: https://industrial.panasonic.com/cdbs/www-data/pdf/RDF0000/ABA0000C1038.pdf; ComponentLink2Description: Digi-Key Listing; ComponentLink2URL: https://www.digikey.com/product-detail/en/panasonic-electronic-components/ECA-1AHG682/P5525-ND/245124; Tolerance: 20%; Voltage: 10V; Price: 1.31; Device Package: Radial, Can, 16mm
footprint CAP AL TH D16 L7.5 H27
pins: 1, 2

## ECA-1AM102
designator C?, comment 1000uF  (value not drawn)
CAP ALUM 1000UF 20% 10V RADIAL; Part Number: ECA-1AM102; Manufacturer: Panasonic Electronic Components; TemperatureRange: -40C ~ 85C; Type: Polar; Ripple Current: 630mA @ 120Hz; Value: 1000uF; PartId: 24701; Supplier 1: Digi-Key; Supplier Part Number 1: P5127-ND; ComponentLink1Description: Datasheet; ComponentLink1URL: http://industrial.panasonic.com/www-cgi/jvcr13pz.cgi?E+PZ+3+ABA0012+ECA1AM102+7+WW; ComponentLink2Description: Digi-Key Listing; ComponentLink2URL: https://www.digikey.com/product-detail/en/panasonic-electronic-components/ECA-1AM102/P5127-ND/244986; Tolerance: 20%; Voltage: 10V; Price: 0.38; Device Package: Radial, Can, 10mm
footprint CAP AL TH D10 L5 H14.5
pins: 1, 2

## ECA-1AM102B
designator C?, comment 1000uF  (value not drawn)
CAP ALUM 1000UF 20% 10V RADIAL; Part Number: ECA-1AM102B; Manufacturer: Panasonic Electronic Components; TemperatureRange: -40C ~ 85C; Type: Polar; Ripple Current: 630mA @ 120Hz; Value: 1000uF; PartId: 24510; Supplier 1: Digi-Key; Supplier Part Number 1: P10367TB-ND; ComponentLink1Description: Datasheet; ComponentLink1URL: http://industrial.panasonic.com/www-cgi/jvcr13pz.cgi?E+PZ+3+ABA0012+ECA1AM102B+7+WW; ComponentLink2Description: Digi-Key Listing; ComponentLink2URL: https://www.digikey.com/product-detail/en/panasonic-electronic-components/ECA-1AM102B/P10367TB-ND/268452; Tolerance: 20%; Voltage: 10V; Price: 0.1262; Device Package: Radial, Can, 10mm
footprint CAP AL TH D10 L5 H14.5
pins: 1, 2

## ECA-1AM103
designator C?, comment 10000uF  (value not drawn)
CAP ALUM 10000UF 20% 10V RADIAL; Part Number: ECA-1AM103; Manufacturer: Panasonic Electronic Components; TemperatureRange: -40C ~ 85C; Type: Polar; Ripple Current: 1.6A @ 120Hz; Value: 10000uF; PartId: 26997; Supplier 1: Digi-Key; Supplier Part Number 1: P5132-ND; ComponentLink1Description: Datasheet; ComponentLink1URL: http://industrial.panasonic.com/www-cgi/jvcr13pz.cgi?E+PZ+3+ABA0012+ECA1AM103+7+WW; ComponentLink2Description: Digi-Key Listing; ComponentLink2URL: https://www.digikey.com/product-detail/en/panasonic-electronic-components/ECA-1AM103/P5132-ND/244991; Tolerance: 20%; Voltage: 10V; Price: 1.31; Device Package: Radial, Can, 16mm
footprint CAP AL TH D16 L7.5 H33.5
pins: 1, 2

## ECA-1AM222
designator C?, comment 2200uF  (value not drawn)
CAP ALUM 2200UF 20% 10V RADIAL; Part Number: ECA-1AM222; Manufacturer: Panasonic Electronic Components; TemperatureRange: -40C ~ 85C; Type: Polar; Ripple Current: 920mA @ 120Hz; Value: 2200uF; PartId: 25848; Supplier 1: Digi-Key; Supplier Part Number 1: P5128-ND; ComponentLink1Description: Datasheet; ComponentLink1URL: http://industrial.panasonic.com/www-cgi/jvcr13pz.cgi?E+PZ+3+ABA0012+ECA1AM222+7+WW; ComponentLink2Description: Digi-Key Listing; ComponentLink2URL: https://www.digikey.com/product-detail/en/panasonic-electronic-components/ECA-1AM222/P5128-ND/244987; Tolerance: 20%; Voltage: 10V; Price: 0.54; Device Package: Radial, Can, 10mm
footprint CAP AL TH D10 L5 H22
pins: 1, 2
